# Altium schematic symbol library 724452_RPL-HX_Mobile_AEP_Rev0p91_Library.SchLib: 162 symbols (part 4 of 5) (continued)
## DG2_IP_NB_SKU1_SKU2_SKU3_EXT (continued)
part W pins: AT31 VSSSAMC_SENSE_N (io), AU31 VCCSAMC_SENSE_P (io), H1 VSS_GT_SENSE_N (io), J1 VCC_GT_SENSE_P (io), J17 VCCSA_61 (io), J18 VCCSA_62 (io), J19 VCCSA_63 (io), J20 VCCSA_64 (io), J21 VCC1P8_14 (io), J22 VCC1P8_15 (io), J23 VCC1P8_16 (io), J42 VCC1P8_1 (io), J43 VCCSA_52 (io), J44 VCCSA_53 (io), J45 VCCSA_54 (io), J46 VCC1P8_8 (io), J47 VCC1P8_9 (io), K18 VCCSA_65 (io), K19 VCCSA_66 (io), K20 VCCSA_67 (io), K21 VCCSA_68 (io), K22 VCC1P8_17 (io), K23 VCC1P8_18 (io), K24 VCC1P8_19 (io), K30 VCCSA_73 (io), K31 VCC1P8_27 (io), K32 VSS_933 (io), K33 VCC1P8_29 (io), K34 VCCSA_75 (io), K35 VCCSA_71 (io), K36 VCC1P8_22 (io), K37 RSVD_37 (io), K38 VCCPLLVPH_1 (io), K39 VCC1P8_25 (io), K40 VCC1P8_2 (io), K41 VCC1P8_3 (io), K42 VCC1P8_4 (io), K43 VCCSA_55 (io), K44 VCCSA_56 (io), K45 VCCSA_57 (io), K46 VCC1P8_10 (io), K47 VCC1P8_11 (io), L20 VCCSA_69 (io), L21 VCCSA_70 (io), L22 VCC1P8_24 (io), L23 VCC1P8_20 (io), L24 VCC1P8_21 (io), L30 VCCSA_74 (io), L31 VCC1P8_28 (io), L32 VSS_934 (io), L33 VCC1P8_30 (io), L34 VCCSA_76 (io), L35 VCCSA_72 (io), L36 VCC1P8_23 (io), L37 RSVD_38 (io), L38 VCCPLLVPH_2 (io), L39 VCC1P8_26 (io), L40 VCC1P8_5 (io), L41 VCC1P8_6 (io), L42 VCC1P8_7 (io), L43 VCCSA_58 (io), L44 VCCSA_59 (io), L45 VCCSA_60 (io), L46 VCC1P8_12 (io), L47 VCC1P8_13 (io)
part X pins: AC11 VCCSAMC_1 (io), AC47 VCCSAMC_2 (io), AF11 VCCSAMC_3 (io), AF47 VCCSAMC_4 (io), AK11 VCCSAMC_5 (io), AK47 VCCSAMC_6 (io), AL11 VCCSAMC_7 (io), AL47 VCCSAMC_8 (io), AP11 VCCSAMC_9 (io), AP12 VCCSAMC_10 (io), AP27 VCCSA_1 (io), AP28 VCCSA_2 (io), AP29 VCCSA_3 (io), AP30 VCCSA_4 (io), AP31 VCCSA_5 (io), AP46 VCCSAMC_11 (io), AP47 VCCSAMC_12 (io), AR28 VCCSA_6 (io), AR29 VCCSA_7 (io), AR30 VCCSA_8 (io), AR31 VCCSA_9 (io), AT28 VCCSA_10 (io), AT30 VCCSA_11 (io), AU28 VCCSA_12 (io), AU30 VCCSA_13 (io), AV15 VCCSAMC_13 (io), AV16 VCCSAMC_14 (io), AV17 VCCSAMC_15 (io), AV18 VCCSAMC_16 (io), AV25 VCCSAMC_17 (io), AV26 VCCSAMC_18 (io), AV27 VCCSAMC_19 (io), AV28 VCCSAMC_20 (io), AV30 VCCSAMC_21 (io), AV31 VCCSAMC_22 (io), AV32 VCCSAMC_23 (io), AV33 VCCSAMC_24 (io), AV40 VCCSAMC_25 (io), AV41 VCCSAMC_26 (io), AV42 VCCSAMC_27 (io), AV43 VCCSAMC_28 (io), AW15 VCCSAMC_29 (io), AW16 VCCSAMC_30 (io), AW17 VCCSAMC_31 (io), AW18 VCCSAMC_32 (io), AW25 VCCSAMC_33 (io), AW26 VCCSAMC_34 (io), AW27 VCCSAMC_35 (io), AW28 VCCSAMC_36 (io), AW30 VCCSAMC_37 (io), AW31 VCCSAMC_38 (io), AW32 VCCSAMC_39 (io), AW33 VCCSAMC_40 (io), AW40 VCCSAMC_41 (io), AW41 VCCSAMC_42 (io), AW42 VCCSAMC_43 (io), AW43 VCCSAMC_44 (io), J48 VCCSA_14 (io), J49 VCCSA_15 (io), K25 VCCSA_16 (io), K26 VCCSA_17 (io), K27 VCCSA_18 (io), K28 VCCSA_19 (io), K29 VCCSA_20 (io), K48 VCCSA_21 (io), K49 VCCSA_22 (io), L25 VCCSA_23 (io), L26 VCCSA_24 (io), L27 VCCSA_25 (io), L28 VCCSA_26 (io), L29 VCCSA_27 (io), L48 VCCSA_28 (io), L49 VCCSA_29 (io), L50 VCCSA_30 (io), M48 VCCSA_31 (io), M49 VCCSA_32 (io), M50 VCCSA_33 (io), M51 VCCSA_34 (io), M52 VCCSA_35 (io), M53 VCCSA_36 (io), M54 VCCSA_37 (io), M55 VCCSA_38 (io), M56 VCCSA_39 (io), M57 VCCSA_40 (io), N48 VCCSA_41 (io), N49 VCCSA_42 (io), N50 VCCSA_43 (io), N51 VCCSA_44 (io), N52 VCCSA_45 (io), N53 VCCSA_46 (io), N54 VCCSA_47 (io), N55 VCCSA_48 (io), N56 VCCSA_49 (io), N57 VCCSA_50 (io)
part Y pins: AA17 VCCGT_354 (io), AA41 VCCGT_355 (io), AB17 VCCGT_356 (io), AB18 VCCGT_357 (io), AB19 VCCGT_358 (io), AB20 VCCGT_359 (io), AB21 VCCGT_360 (io), AB22 VCCGT_361 (io), AB23 VCCGT_362 (io), AB24 VCCGT_363 (io), AB25 VCCGT_364 (io), AB26 VCCGT_365 (io), AB27 VCCGT_366 (io), AB28 VCCGT_367 (io), AB29 VCCGT_368 (io), AB30 VCCGT_369 (io), AB31 VCCGT_370 (io), AB32 VCCGT_371 (io), AB33 VCCGT_372 (io), AB34 VCCGT_373 (io), AB35 VCCGT_374 (io), AB36 VCCGT_375 (io), AB37 VCCGT_376 (io), AB38 VCCGT_377 (io), AB39 VCCGT_378 (io), AB40 VCCGT_379 (io), AB41 VCCGT_380 (io), AC17 VCCGT_381 (io), AC18 VCCGT_382 (io), AC19 VCCGT_383 (io), AC20 VCCGT_384 (io), AC21 VCCGT_385 (io), AC22 VCCGT_386 (io), AC23 VCCGT_387 (io), AC24 VCCGT_388 (io), AC25 VCCGT_389 (io), AC26 VCCGT_390 (io), AC27 VCCGT_391 (io), AC28 VCCGT_392 (io), AC29 VCCGT_393 (io), AC30 VCCGT_394 (io), AC31 VCCGT_395 (io), AC32 VCCGT_396 (io), AC33 VCCGT_397 (io), AC34 VCCGT_398 (io), AC35 VCCGT_399 (io), AC36 VCCGT_400 (io), AC37 VCCGT_401 (io), AC38 VCCGT_402 (io), AC39 VCCGT_403 (io), AC40 VCCGT_404 (io), AC41 VCCGT_405 (io), AD17 VCCGT_406 (io), AD41 VCCGT_407 (io), AE17 VCCGT_408 (io), AE18 VCCGT_409 (io), AE19 VCCGT_410 (io), AE20 VCCGT_411 (io), AE21 VCCGT_412 (io), AE22 VCCGT_413 (io), AE23 VCCGT_414 (io), AE24 VCCGT_415 (io), AE25 VCCGT_416 (io), AE26 VCCGT_417 (io), AE27 VCCGT_418 (io), AE28 VCCGT_419 (io), AE29 VCCGT_420 (io), AE30 VCCGT_421 (io), AE31 VCCGT_422 (io), AE32 VCCGT_423 (io), AE33 VCCGT_424 (io), AE34 VCCGT_425 (io), AE35 VCCGT_426 (io), AE36 VCCGT_427 (io), AE37 VCCGT_428 (io), AE38 VCCGT_429 (io), AE39 VCCGT_430 (io), AE40 VCCGT_431 (io), AE41 VCCGT_432 (io), AF17 VCCGT_433 (io), AF18 VCCGT_434 (io), AF19 VCCGT_435 (io), AF20 VCCGT_436 (io), AF21 VCCGT_437 (io), AF22 VCCGT_438 (io), AF23 VCCGT_439 (io), AF24 VCCGT_440 (io), AF25 VCCGT_441 (io), AF26 VCCGT_442 (io), AF27 VCCGT_443 (io), AF28 VCCGT_444 (io), AF29 VCCGT_445 (io), AF30 VCCGT_446 (io), AF31 VCCGT_447 (io), AF32 VCCGT_448 (io), AF33 VCCGT_449 (io), AF34 VCCGT_450 (io), AF35 VCCGT_451 (io), AF36 VCCGT_452 (io), AF37 VCCGT_453 (io), AF38 VCCGT_454 (io), AF39 VCCGT_455 (io), AF40 VCCGT_456 (io), AF41 VCCGT_457 (io), AG17 VCCGT_458 (io), AG41 VCCGT_459 (io), AH17 VCCGT_460 (io), AH18 VCCGT_461 (io), AH19 VCCGT_462 (io), AH20 VCCGT_463 (io), AH21 VCCGT_464 (io), AH22 VCCGT_465 (io), AH23 VCCGT_466 (io), AH24 VCCGT_467 (io), AH25 VCCGT_468 (io), AH26 VCCGT_469 (io), AH27 VCCGT_470 (io), AH28 VCCGT_471 (io), AH29 VCCGT_472 (io), AH30 VCCGT_473 (io), AH31 VCCGT_474 (io), AH32 VCCGT_475 (io), AH33 VCCGT_476 (io), AH34 VCCGT_477 (io), AH35 VCCGT_478 (io), AH36 VCCGT_479 (io), AH37 VCCGT_480 (io), AH38 VCCGT_481 (io), AH39 VCCGT_482 (io), AH40 VCCGT_483 (io), AH41 VCCGT_484 (io), AJ17 VCCGT_485 (io), AJ18 VCCGT_486 (io), AJ19 VCCGT_487 (io), AJ20 VCCGT_488 (io), AJ21 VCCGT_489 (io), AJ22 VCCGT_490 (io), AJ23 VCCGT_491 (io), AJ24 VCCGT_492 (io), AJ25 VCCGT_493 (io), AJ26 VCCGT_494 (io), AJ27 VCCGT_495 (io), AJ28 VCCGT_496 (io), AJ29 VCCGT_497 (io), AJ30 VCCGT_498 (io), AJ31 VCCGT_499 (io), AJ32 VCCGT_500 (io), AJ33 VCCGT_501 (io), AJ34 VCCGT_502 (io), AJ35 VCCGT_503 (io), AJ36 VCCGT_504 (io)
part Z pins: AJ37 VCCGT_204 (io), AJ38 VCCGT_205 (io), AJ39 VCCGT_206 (io), AJ40 VCCGT_207 (io), AJ41 VCCGT_208 (io), AK18 VCCGT_209 (io), AK19 VCCGT_210 (io), AK21 VCCGT_211 (io), AK22 VCCGT_212 (io), AK24 VCCGT_213 (io), AK25 VCCGT_214 (io), AK27 VCCGT_215 (io), AK28 VCCGT_216 (io), AK30 VCCGT_217 (io), AK31 VCCGT_218 (io), AK33 VCCGT_219 (io), AK34 VCCGT_220 (io), AK36 VCCGT_221 (io), AK37 VCCGT_222 (io), AK39 VCCGT_223 (io), AK40 VCCGT_224 (io), J2 VCCGT_230 (io), J3 VCCGT_231 (io), J4 VCCGT_232 (io), J5 VCCGT_233 (io), J6 VCCGT_234 (io), J7 VCCGT_235 (io), J8 VCCGT_236 (io), J9 VCCGT_237 (io), J10 VCCGT_225 (io), J11 VCCGT_226 (io), J12 VCCGT_227 (io), J13 VCCGT_228 (io), J14 VCCGT_229 (io), K1 VCCGT_238 (io), K2 VCCGT_245 (io), K3 VCCGT_246 (io), K4 VCCGT_247 (io), K5 VCCGT_248 (io), K6 VCCGT_249 (io), K7 VCCGT_250 (io), K8 VCCGT_251 (io), K9 VCCGT_252 (io), K10 VCCGT_239 (io), K11 VCCGT_240 (io), K12 VCCGT_241 (io), K13 VCCGT_242 (io), K14 VCCGT_243 (io), K15 VCCGT_244 (io), L1 VCCGT_253 (io), L2 VCCGT_261 (io), L3 VCCGT_262 (io), L4 VCCGT_263 (io), L5 VCCGT_264 (io), L6 VCCGT_265 (io), L7 VCCGT_266 (io), L8 VCCGT_267 (io), L9 VCCGT_268 (io), L10 VCCGT_254 (io), L11 VCCGT_255 (io), L12 VCCGT_256 (io), L13 VCCGT_257 (io), L14 VCCGT_258 (io), L15 VCCGT_259 (io), L16 VCCGT_260 (io), M1 VCCGT_269 (io), M2 VCCGT_279 (io), M3 VCCGT_280 (io), M4 VCCGT_281 (io), M5 VCCGT_282 (io), M6 VCCGT_283 (io), M7 VCCGT_284 (io), M8 VCCGT_285 (io), M9 VCCGT_286 (io), M10 VCCGT_270 (io), M11 VCCGT_271 (io), M12 VCCGT_272 (io), M13 VCCGT_273 (io), M14 VCCGT_274 (io), M15 VCCGT_275 (io), M16 VCCGT_276 (io), M17 VCCGT_277 (io), M18 VCCGT_278 (io), N1 VCCGT_287 (io), N2 VCCGT_298 (io), N3 VCCGT_309 (io), N4 VCCGT_320 (io), N5 VCCGT_328 (io), N6 VCCGT_329 (io), N7 VCCGT_330 (io), N8 VCCGT_331 (io), N9 VCCGT_332 (io), N10 VCCGT_288 (io), N11 VCCGT_289 (io), N12 VCCGT_290 (io), N13 VCCGT_291 (io), N14 VCCGT_292 (io), N15 VCCGT_293 (io), N16 VCCGT_294 (io), N17 VCCGT_295 (io), N18 VCCGT_296 (io), N19 VCCGT_297 (io), N20 VCCGT_299 (io), N21 VCCGT_300 (io), N22 VCCGT_301 (io), N23 VCCGT_302 (io), N24 VCCGT_303 (io), N25 VCCGT_304 (io), N26 VCCGT_305 (io), N27 VCCGT_306 (io), N28 VCCGT_307 (io), N29 VCCGT_308 (io), N30 VCCGT_310 (io), N31 VCCGT_311 (io), N32 VCCGT_312 (io), N33 VCCGT_313 (io), N34 VCCGT_314 (io), N35 VCCGT_315 (io), N36 VCCGT_316 (io), N37 VCCGT_317 (io), N38 VCCGT_318 (io), N39 VCCGT_319 (io), N40 VCCGT_321 (io), N41 VCCGT_322 (io), N42 VCCGT_323 (io), N43 VCCGT_324 (io), N44 VCCGT_325 (io), N45 VCCGT_326 (io), N46 VCCGT_327 (io), P1 VCCGT_333 (io), P2 VCCGT_344 (io), P10 VCCGT_334 (io), P11 VCCGT_335 (io), P12 VCCGT_336 (io), P13 VCCGT_337 (io), P14 VCCGT_338 (io), P15 VCCGT_339 (io), P16 VCCGT_340 (io), P17 VCCGT_341 (io), P18 VCCGT_342 (io), P19 VCCGT_343 (io), P20 VCCGT_345 (io), P21 VCCGT_346 (io), P22 VCCGT_347 (io), P23 VCCGT_348 (io), P24 VCCGT_349 (io), P25 VCCGT_350 (io), P26 VCCGT_351 (io), P27 VCCGT_352 (io), P28 VCCGT_353 (io)
part 27 pins: P3 VCCGT_55 (io), P4 VCCGT_66 (io), P5 VCCGT_74 (io), P6 VCCGT_75 (io), P7 VCCGT_76 (io), P8 VCCGT_77 (io), P9 VCCGT_78 (io), P29 VCCGT_54 (io), P30 VCCGT_56 (io), P31 VCCGT_57 (io), P32 VCCGT_58 (io), P33 VCCGT_59 (io), P34 VCCGT_60 (io), P35 VCCGT_61 (io), P36 VCCGT_62 (io), P37 VCCGT_63 (io), P38 VCCGT_64 (io), P39 VCCGT_65 (io), P40 VCCGT_67 (io), P41 VCCGT_68 (io), P42 VCCGT_69 (io), P43 VCCGT_70 (io), P44 VCCGT_71 (io), P45 VCCGT_72 (io), P46 VCCGT_73 (io), R1 VCCGT_79 (io), R2 VCCGT_86 (io), R3 VCCGT_87 (io), R4 VCCGT_88 (io), R5 VCCGT_93 (io), R6 VCCGT_94 (io), R7 VCCGT_95 (io), R8 VCCGT_96 (io), R9 VCCGT_97 (io), R10 VCCGT_80 (io), R11 VCCGT_81 (io), R12 VCCGT_82 (io), R13 VCCGT_83 (io), R14 VCCGT_84 (io), R15 VCCGT_85 (io), R43 VCCGT_89 (io), R44 VCCGT_90 (io), R45 VCCGT_91 (io), R46 VCCGT_92 (io), T1 VCCGT_98 (io), T2 VCCGT_109 (io), T3 VCCGT_120 (io), T4 VCCGT_131 (io), T5 VCCGT_139 (io), T6 VCCGT_140 (io), T7 VCCGT_141 (io), T8 VCCGT_142 (io), T9 VCCGT_143 (io), T10 VCCGT_99 (io), T11 VCCGT_100 (io), T12 VCCGT_101 (io), T13 VCCGT_102 (io), T14 VCCGT_103 (io), T15 VCCGT_104 (io), T16 VCCGT_105 (io), T17 VCCGT_106 (io), T18 VCCGT_107 (io), T19 VCCGT_108 (io), T20 VCCGT_110 (io), T21 VCCGT_111 (io), T22 VCCGT_112 (io), T23 VCCGT_113 (io), T24 VCCGT_114 (io), T25 VCCGT_115 (io), T26 VCCGT_116 (io), T27 VCCGT_117 (io), T28 VCCGT_118 (io), T29 VCCGT_119 (io), T30 VCCGT_121 (io), T31 VCCGT_122 (io), T32 VCCGT_123 (io), T33 VCCGT_124 (io), T34 VCCGT_125 (io), T35 VCCGT_126 (io), T36 VCCGT_127 (io), T37 VCCGT_128 (io), T38 VCCGT_129 (io), T39 VCCGT_130 (io), T40 VCCGT_132 (io), T41 VCCGT_133 (io), T42 VCCGT_134 (io), T43 VCCGT_135 (io), T44 VCCGT_136 (io), T45 VCCGT_137 (io), T46 VCCGT_138 (io), U12 VCCGT_144 (io), U13 VCCGT_145 (io), U14 VCCGT_146 (io), U15 VCCGT_147 (io), U16 VCCGT_148 (io), U17 VCCGT_149 (io), U18 VCCGT_150 (io), U19 VCCGT_151 (io), U20 VCCGT_152 (io), U21 VCCGT_153 (io), U22 VCCGT_154 (io), U23 VCCGT_155 (io), U24 VCCGT_156 (io), U25 VCCGT_157 (io), U26 VCCGT_158 (io), U27 VCCGT_159 (io), U28 VCCGT_160 (io), U29 VCCGT_161 (io), U30 VCCGT_162 (io), U31 VCCGT_163 (io), U32 VCCGT_164 (io), U33 VCCGT_165 (io), U34 VCCGT_166 (io), U35 VCCGT_167 (io), U36 VCCGT_168 (io), U37 VCCGT_169 (io), U38 VCCGT_170 (io), U39 VCCGT_171 (io), U40 VCCGT_172 (io), U41 VCCGT_173 (io), U42 VCCGT_174 (io), U43 VCCGT_175 (io), U44 VCCGT_176 (io), U45 VCCGT_177 (io), U46 VCCGT_178 (io), V12 VCCGT_179 (io), V13 VCCGT_180 (io), V14 VCCGT_181 (io), V15 VCCGT_182 (io), V16 VCCGT_183 (io), V17 VCCGT_184 (io), V41 VCCGT_185 (io), V42 VCCGT_186 (io), V43 VCCGT_187 (io), V44 VCCGT_188 (io), V45 VCCGT_189 (io), V46 VCCGT_190 (io), W12 VCCGT_191 (io), W13 VCCGT_192 (io), W14 VCCGT_193 (io), W15 VCCGT_194 (io), W16 VCCGT_195 (io), W17 VCCGT_196 (io), W18 VCCGT_197 (io), W19 VCCGT_198 (io), W20 VCCGT_199 (io), W21 VCCGT_200 (io), W22 VCCGT_201 (io), W23 VCCGT_202 (io), W24 VCCGT_203 (io)
part 28 pins: W25 VCCGT_1 (io), W26 VCCGT_2 (io), W27 VCCGT_3 (io), W28 VCCGT_4 (io), W29 VCCGT_5 (io), W30 VCCGT_6 (io), W31 VCCGT_7 (io), W32 VCCGT_8 (io), W33 VCCGT_9 (io), W34 VCCGT_10 (io), W35 VCCGT_11 (io), W36 VCCGT_12 (io), W37 VCCGT_13 (io), W38 VCCGT_14 (io), W39 VCCGT_15 (io), W40 VCCGT_16 (io), W41 VCCGT_17 (io), W42 VCCGT_18 (io), W43 VCCGT_19 (io), W44 VCCGT_20 (io), W45 VCCGT_21 (io), W46 VCCGT_22 (io), Y14 VCCGT_23 (io), Y15 VCCGT_24 (io), Y16 VCCGT_25 (io), Y17 VCCGT_26 (io), Y18 VCCGT_27 (io), Y19 VCCGT_28 (io), Y20 VCCGT_29 (io), Y21 VCCGT_30 (io), Y22 VCCGT_31 (io), Y23 VCCGT_32 (io), Y24 VCCGT_33 (io), Y25 VCCGT_34 (io), Y26 VCCGT_35 (io), Y27 VCCGT_36 (io), Y28 VCCGT_37 (io), Y29 VCCGT_38 (io), Y30 VCCGT_39 (io), Y31 VCCGT_40 (io), Y32 VCCGT_41 (io), Y33 VCCGT_42 (io), Y34 VCCGT_43 (io), Y35 VCCGT_44 (io), Y36 VCCGT_45 (io), Y37 VCCGT_46 (io), Y38 VCCGT_47 (io), Y39 VCCGT_48 (io), Y40 VCCGT_49 (io), Y41 VCCGT_50 (io), Y42 VCCGT_51 (io), Y43 VCCGT_52 (io), Y44 VCCGT_53 (io)
part 29 pins: A4 VSS_798 (io), A6 VSS_807 (io), A7 VSS_808 (io), A9 VSS_809 (io), A11 VSS_783 (io), A13 VSS_784 (io), A15 VSS_785 (io), A17 VSS_786 (io), A19 VSS_787 (io), A21 VSS_788 (io), A23 VSS_789 (io), A25 VSS_790 (io), A27 VSS_791 (io), A28 VSS_792 (io), A30 VSS_793 (io), A32 VSS_794 (io), A34 VSS_795 (io), A36 VSS_796 (io), A39 VSS_797 (io), A41 VSS_799 (io), A43 VSS_800 (io), A45 VSS_801 (io), A47 VSS_802 (io), A48 VSS_803 (io), A50 VSS_804 (io), A52 VSS_805 (io), A54 VSS_806 (io), AA7 VSS_835 (io), AA11 VSS_810 (io), AA18 VSS_811 (io), AA19 VSS_812 (io), AA20 VSS_813 (io), AA21 VSS_814 (io), AA22 VSS_815 (io), AA23 VSS_816 (io), AA24 VSS_817 (io), AA25 VSS_818 (io), AA26 VSS_819 (io), AA27 VSS_820 (io), AA28 VSS_821 (io), AA29 VSS_822 (io), AA30 VSS_823 (io), AA31 VSS_824 (io), AA32 VSS_825 (io), AA33 VSS_826 (io), AA34 VSS_827 (io), AA35 VSS_828 (io), AA36 VSS_829 (io), AA37 VSS_830 (io), AA38 VSS_831 (io), AA39 VSS_832 (io), AA40 VSS_833 (io), AA47 VSS_834 (io), AB3 VSS_837 (io), AB7 VSS_841 (io), AB11 VSS_836 (io), AB47 VSS_838 (io), AB51 VSS_839 (io), AB53 VSS_840 (io), AC3 VSS_843 (io), AC4 VSS_844 (io), AC5 VSS_847 (io), AC6 VSS_854 (io), AC7 VSS_855 (io), AC8 VSS_856 (io), AC9 VSS_857 (io), AC10 VSS_842 (io), AC48 VSS_845 (io), AC49 VSS_846 (io), AC50 VSS_848 (io), AC51 VSS_849 (io), AC52 VSS_850 (io), AC53 VSS_851 (io), AC54 VSS_852 (io), AC55 VSS_853 (io), AD5 VSS_883 (io), AD7 VSS_885 (io), AD11 VSS_858 (io), AD18 VSS_859 (io), AD19 VSS_860 (io), AD20 VSS_861 (io), AD21 VSS_862 (io), AD22 VSS_863 (io), AD23 VSS_864 (io), AD24 VSS_865 (io), AD25 VSS_866 (io), AD26 VSS_867 (io), AD27 VSS_868 (io), AD28 VSS_869 (io), AD29 VSS_870 (io), AD30 VSS_871 (io), AD31 VSS_872 (io), AD32 VSS_873 (io), AD33 VSS_874 (io), AD34 VSS_875 (io), AD35 VSS_876 (io), AD36 VSS_877 (io), AD37 VSS_878 (io), AD38 VSS_879 (io), AD39 VSS_880 (io), AD40 VSS_881 (io), AD47 VSS_882 (io), AD51 VSS_884 (io), AE11 VSS_886 (io), AE47 VSS_887 (io), AE51 VSS_888 (io), AF3 VSS_890 (io), AF4 VSS_891 (io), AF5 VSS_894 (io), AF6 VSS_901 (io), AF7 VSS_902 (io), AF8 VSS_903 (io), AF9 VSS_904 (io), AF10 VSS_889 (io), AF48 VSS_892 (io), AF49 VSS_893 (io), AF50 VSS_895 (io), AF51 VSS_896 (io), AF52 VSS_897 (io), AF53 VSS_898 (io), AF54 VSS_899 (io), AF55 VSS_900 (io), AG7 VSS_930 (io), AG11 VSS_905 (io), AG18 VSS_906 (io), AG19 VSS_907 (io), AG20 VSS_908 (io), AG21 VSS_909 (io), AG22 VSS_910 (io), AG23 VSS_911 (io), AG24 VSS_912 (io), AG25 VSS_913 (io), AG26 VSS_914 (io), AG27 VSS_915 (io), AG28 VSS_916 (io), AG29 VSS_917 (io), AG30 VSS_918 (io), AG31 VSS_919 (io), AG32 VSS_920 (io), AG33 VSS_921 (io), AG34 VSS_922 (io), AG35 VSS_923 (io), AG36 VSS_924 (io), AG37 VSS_925 (io), AG38 VSS_926 (io), AG39 VSS_927 (io), AG40 VSS_928 (io), AG47 VSS_929 (io), AH11 VSS_931 (io), AH47 VSS_932 (io)
part 30 pins: AH7 VSS_634 (io), AH51 VSS_633 (io), AJ3 VSS_637 (io), AJ4 VSS_638 (io), AJ5 VSS_642 (io), AJ6 VSS_650 (io), AJ7 VSS_651 (io), AJ8 VSS_652 (io), AJ9 VSS_653 (io), AJ10 VSS_635 (io), AJ11 VSS_636 (io), AJ47 VSS_639 (io), AJ48 VSS_640 (io), AJ49 VSS_641 (io), AJ50 VSS_643 (io), AJ51 VSS_644 (io), AJ52 VSS_645 (io), AJ53 VSS_646 (io), AJ54 VSS_647 (io), AJ55 VSS_648 (io), AJ56 VSS_649 (io), AK17 VSS_654 (io), AK20 VSS_655 (io), AK23 VSS_656 (io), AK26 VSS_657 (io), AK29 VSS_658 (io), AK32 VSS_659 (io), AK35 VSS_660 (io), AK38 VSS_661 (io), AK41 VSS_662 (io), AL2 VSS_664 (io), AL3 VSS_665 (io), AL4 VSS_666 (io), AL5 VSS_669 (io), AL6 VSS_676 (io), AL7 VSS_677 (io), AL8 VSS_678 (io), AL9 VSS_679 (io), AL10 VSS_663 (io), AL48 VSS_667 (io), AL49 VSS_668 (io), AL50 VSS_670 (io), AL51 VSS_671 (io), AL52 VSS_672 (io), AL53 VSS_673 (io), AL54 VSS_674 (io), AL55 VSS_675 (io), AM7 VSS_684 (io), AM11 VSS_680 (io), AM47 VSS_681 (io), AM51 VSS_682 (io), AM54 VSS_683 (io), AN11 VSS_685 (io), AN13 VSS_686 (io), AN45 VSS_687 (io), AN47 VSS_688 (io), AN51 VSS_689 (io), AP3 VSS_693 (io), AP4 VSS_695 (io), AP5 VSS_699 (io), AP6 VSS_706 (io), AP7 VSS_707 (io), AP8 VSS_708 (io), AP9 VSS_709 (io), AP10 VSS_690 (io), AP14 VSS_691 (io), AP25 VSS_692 (io), AP32 VSS_694 (io), AP43 VSS_696 (io), AP48 VSS_697 (io), AP49 VSS_698 (io), AP50 VSS_700 (io), AP51 VSS_701 (io), AP52 VSS_702 (io), AP53 VSS_703 (io), AP54 VSS_704 (io), AP55 VSS_705 (io), AR7 VSS_716 (io), AR11 VSS_710 (io), AR15 VSS_711 (io), AR26 VSS_712 (io), AR32 VSS_713 (io), AR43 VSS_714 (io), AR47 VSS_715 (io), AT3 VSS_721 (io), AT7 VSS_727 (io), AT11 VSS_717 (io), AT15 VSS_718 (io), AT26 VSS_719 (io), AT29 VSS_720 (io), AT32 VSS_722 (io), AT43 VSS_723 (io), AT47 VSS_724 (io), AT51 VSS_725 (io), AT53 VSS_726 (io), AU3 VSS_744 (io), AU4 VSS_753 (io), AU5 VSS_762 (io), AU6 VSS_769 (io), AU7 VSS_770 (io), AU8 VSS_771 (io), AU9 VSS_772 (io), AU10 VSS_728 (io), AU11 VSS_729 (io), AU14 VSS_730 (io), AU15 VSS_731 (io), AU16 VSS_732 (io), AU17 VSS_733 (io), AU18 VSS_734 (io), AU19 VSS_735 (io), AU20 VSS_736 (io), AU21 VSS_737 (io), AU22 VSS_738 (io), AU23 VSS_739 (io), AU24 VSS_740 (io), AU25 VSS_741 (io), AU26 VSS_742 (io), AU29 VSS_743 (io), AU32 VSS_745 (io), AU33 VSS_746 (io), AU34 VSS_747 (io), AU35 VSS_748 (io), AU36 VSS_749 (io), AU37 VSS_750 (io), AU38 VSS_751 (io), AU39 VSS_752 (io), AU40 VSS_754 (io), AU41 VSS_755 (io), AU42 VSS_756 (io), AU43 VSS_757 (io), AU44 VSS_758 (io), AU47 VSS_759 (io), AU48 VSS_760 (io), AU49 VSS_761 (io), AU50 VSS_763 (io), AU51 VSS_764 (io), AU52 VSS_765 (io), AU53 VSS_766 (io), AU54 VSS_767 (io), AU55 VSS_768 (io), AV5 VSS_782 (io), AV11 VSS_773 (io), AV14 VSS_774 (io), AV19 VSS_775 (io), AV24 VSS_776 (io), AV29 VSS_777 (io), AV34 VSS_778 (io), AV39 VSS_779 (io), AV44 VSS_780 (io), AV47 VSS_781 (io)
part 31 pins: AV7 VSS_484 (io), AV51 VSS_483 (io), AW11 VSS_485 (io), AW14 VSS_486 (io), AW19 VSS_487 (io), AW24 VSS_488 (io), AW29 VSS_489 (io), AW34 VSS_490 (io), AW39 VSS_491 (io), AW44 VSS_492 (io), AW47 VSS_493 (io), AW51 VSS_494 (io), AY3 VSS_515 (io), AY4 VSS_526 (io), AY5 VSS_537 (io), AY6 VSS_544 (io), AY7 VSS_545 (io), AY8 VSS_546 (io), AY9 VSS_547 (io), AY10 VSS_495 (io), AY11 VSS_496 (io), AY12 VSS_497 (io), AY13 VSS_498 (io), AY14 VSS_499 (io), AY15 VSS_500 (io), AY16 VSS_501 (io), AY17 VSS_502 (io), AY18 VSS_503 (io), AY19 VSS_504 (io), AY20 VSS_505 (io), AY21 VSS_506 (io), AY22 VSS_507 (io), AY23 VSS_508 (io), AY24 VSS_509 (io), AY25 VSS_510 (io), AY26 VSS_511 (io), AY27 VSS_512 (io), AY28 VSS_513 (io), AY29 VSS_514 (io), AY30 VSS_516 (io), AY31 VSS_517 (io), AY32 VSS_518 (io), AY33 VSS_519 (io), AY34 VSS_520 (io), AY35 VSS_521 (io), AY36 VSS_522 (io), AY37 VSS_523 (io), AY38 VSS_524 (io), AY39 VSS_525 (io), AY40 VSS_527 (io), AY41 VSS_528 (io), AY42 VSS_529 (io), AY43 VSS_530 (io), AY44 VSS_531 (io), AY45 VSS_532 (io), AY46 VSS_533 (io), AY47 VSS_534 (io), AY48 VSS_535 (io), AY49 VSS_536 (io), AY50 VSS_538 (io), AY51 VSS_539 (io), AY52 VSS_540 (io), AY53 VSS_541 (io), AY54 VSS_542 (io), AY55 VSS_543 (io), B6 VSS_558 (io), B23 VSS_548 (io), B24 VSS_549 (io), B25 VSS_550 (io), B26 VSS_551 (io), B27 VSS_552 (io), B34 VSS_553 (io), B36 VSS_554 (io), B47 VSS_555 (io), B54 VSS_556 (io), B56 VSS_557 (io), BA7 VSS_572 (io), BA11 VSS_559 (io), BA14 VSS_560 (io), BA17 VSS_561 (io), BA20 VSS_562 (io), BA23 VSS_563 (io), BA26 VSS_564 (io), BA29 VSS_565 (io), BA32 VSS_566 (io), BA35 VSS_567 (io), BA38 VSS_568 (io), BA41 VSS_569 (io), BA44 VSS_570 (io), BA47 VSS_571 (io), BB7 VSS_587 (io), BB11 VSS_573 (io), BB14 VSS_574 (io), BB17 VSS_575 (io), BB20 VSS_576 (io), BB23 VSS_577 (io), BB26 VSS_578 (io), BB29 VSS_579 (io), BB32 VSS_580 (io), BB35 VSS_581 (io), BB38 VSS_582 (io), BB41 VSS_583 (io), BB44 VSS_584 (io), BB47 VSS_585 (io), BB51 VSS_586 (io), BC3 VSS_596 (io), BC4 VSS_600 (io), BC5 VSS_606 (io), BC6 VSS_613 (io), BC7 VSS_614 (io), BC8 VSS_615 (io), BC9 VSS_616 (io), BC10 VSS_588 (io), BC11 VSS_589 (io), BC14 VSS_590 (io), BC17 VSS_591 (io), BC20 VSS_592 (io), BC23 VSS_593 (io), BC26 VSS_594 (io), BC29 VSS_595 (io), BC32 VSS_597 (io), BC35 VSS_598 (io), BC38 VSS_599 (io), BC41 VSS_601 (io), BC44 VSS_602 (io), BC47 VSS_603 (io), BC48 VSS_604 (io), BC49 VSS_605 (io), BC50 VSS_607 (io), BC51 VSS_608 (io), BC52 VSS_609 (io), BC53 VSS_610 (io), BC54 VSS_611 (io), BC55 VSS_612 (io), BD11 VSS_617 (io), BD12 VSS_618 (io), BD14 VSS_619 (io), BD15 VSS_620 (io), BD16 VSS_621 (io), BD17 VSS_622 (io), BD18 VSS_623 (io), BD20 VSS_624 (io), BD21 VSS_625 (io), BD22 VSS_626 (io), BD23 VSS_627 (io), BD24 VSS_628 (io), BD26 VSS_629 (io), BD27 VSS_630 (io), BD28 VSS_631 (io), BD29 VSS_632 (io)
part 32 pins: BD7 VSS_350 (io), BD30 VSS_333 (io), BD32 VSS_334 (io), BD33 VSS_335 (io), BD34 VSS_336 (io), BD35 VSS_337 (io), BD36 VSS_338 (io), BD38 VSS_339 (io), BD39 VSS_340 (io), BD40 VSS_341 (io), BD41 VSS_342 (io), BD42 VSS_343 (io), BD44 VSS_344 (io), BD45 VSS_345 (io), BD46 VSS_346 (io), BD47 VSS_347 (io), BD51 VSS_348 (io), BD54 VSS_349 (io), BE11 VSS_351 (io), BE14 VSS_352 (io), BE17 VSS_353 (io), BE20 VSS_354 (io), BE23 VSS_355 (io), BE26 VSS_356 (io), BE29 VSS_357 (io), BE32 VSS_358 (io), BE35 VSS_359 (io), BE38 VSS_360 (io), BE41 VSS_361 (io), BE44 VSS_362 (io), BE47 VSS_363 (io), BE51 VSS_364 (io), BF3 VSS_375 (io), BF4 VSS_380 (io), BF5 VSS_386 (io), BF6 VSS_393 (io), BF7 VSS_394 (io), BF8 VSS_395 (io), BF9 VSS_396 (io), BF10 VSS_365 (io), BF11 VSS_366 (io), BF12 VSS_367 (io), BF14 VSS_368 (io), BF17 VSS_369 (io), BF20 VSS_370 (io), BF23 VSS_371 (io), BF24 VSS_372 (io), BF26 VSS_373 (io), BF29 VSS_374 (io), BF32 VSS_376 (io), BF35 VSS_377 (io), BF36 VSS_378 (io), BF38 VSS_379 (io), BF41 VSS_381 (io), BF44 VSS_382 (io), BF47 VSS_383 (io), BF48 VSS_384 (io), BF49 VSS_385 (io), BF50 VSS_387 (io), BF51 VSS_388 (io), BF52 VSS_389 (io), BF53 VSS_390 (io), BF54 VSS_391 (io), BF55 VSS_392 (io), BG1 VSS_397 (io), BG7 VSS_413 (io), BG11 VSS_398 (io), BG14 VSS_399 (io), BG17 VSS_400 (io), BG20 VSS_401 (io), BG23 VSS_402 (io), BG26 VSS_403 (io), BG29 VSS_404 (io), BG32 VSS_405 (io), BG35 VSS_406 (io), BG38 VSS_407 (io), BG40 VSS_408 (io), BG41 VSS_409 (io), BG44 VSS_410 (io), BG47 VSS_411 (io), BG57 VSS_412 (io), BH1 VSS_414 (io), BH2 VSS_419 (io), BH7 VSS_433 (io), BH10 VSS_415 (io), BH11 VSS_416 (io), BH14 VSS_417 (io), BH17 VSS_418 (io), BH20 VSS_420 (io), BH22 VSS_421 (io), BH23 VSS_422 (io), BH26 VSS_423 (io), BH29 VSS_424 (io), BH32 VSS_425 (io), BH35 VSS_426 (io), BH38 VSS_427 (io), BH41 VSS_428 (io), BH44 VSS_429 (io), BH47 VSS_430 (io), BH51 VSS_431 (io), BH53 VSS_432 (io), BJ2 VSS_435 (io), BJ3 VSS_436 (io), BJ4 VSS_437 (io), BJ5 VSS_440 (io), BJ6 VSS_448 (io), BJ7 VSS_449 (io), BJ8 VSS_450 (io), BJ9 VSS_451 (io), BJ10 VSS_434 (io), BJ48 VSS_438 (io), BJ49 VSS_439 (io), BJ50 VSS_441 (io), BJ51 VSS_442 (io), BJ52 VSS_443 (io), BJ53 VSS_444 (io), BJ54 VSS_445 (io), BJ55 VSS_446 (io), BJ56 VSS_447 (io), BK4 VSS_453 (io), BK7 VSS_457 (io), BK10 VSS_452 (io), BK48 VSS_454 (io), BK54 VSS_455 (io), BK55 VSS_456 (io), C6 VSS_481 (io), C8 VSS_482 (io), C10 VSS_458 (io), C12 VSS_459 (io), C14 VSS_460 (io), C16 VSS_461 (io), C18 VSS_462 (io), C20 VSS_463 (io), C22 VSS_464 (io), C23 VSS_465 (io), C25 VSS_466 (io), C27 VSS_467 (io), C29 VSS_468 (io), C31 VSS_469 (io), C33 VSS_470 (io), C34 VSS_471 (io), C36 VSS_472 (io), C38 VSS_473 (io), C40 VSS_474 (io), C47 VSS_475 (io), C49 VSS_476 (io), C51 VSS_477 (io), C53 VSS_478 (io), C54 VSS_479 (io), C57 VSS_480 (io)